# Altium footprint library Xavier_NX_Carrier_Board_v1.1.PcbLib: 52 footprints (part 2 of 4)
Each footprint in its own frame and in the unit in brackets; x right, y up, seen from the top. Pads: shape width x height; smd on the part's side, far side on the other; paste and mask are expansions set on the pad; w line width, h text height; cw(c..) or ccw(c..) is an arc to the next point about the centre after c.
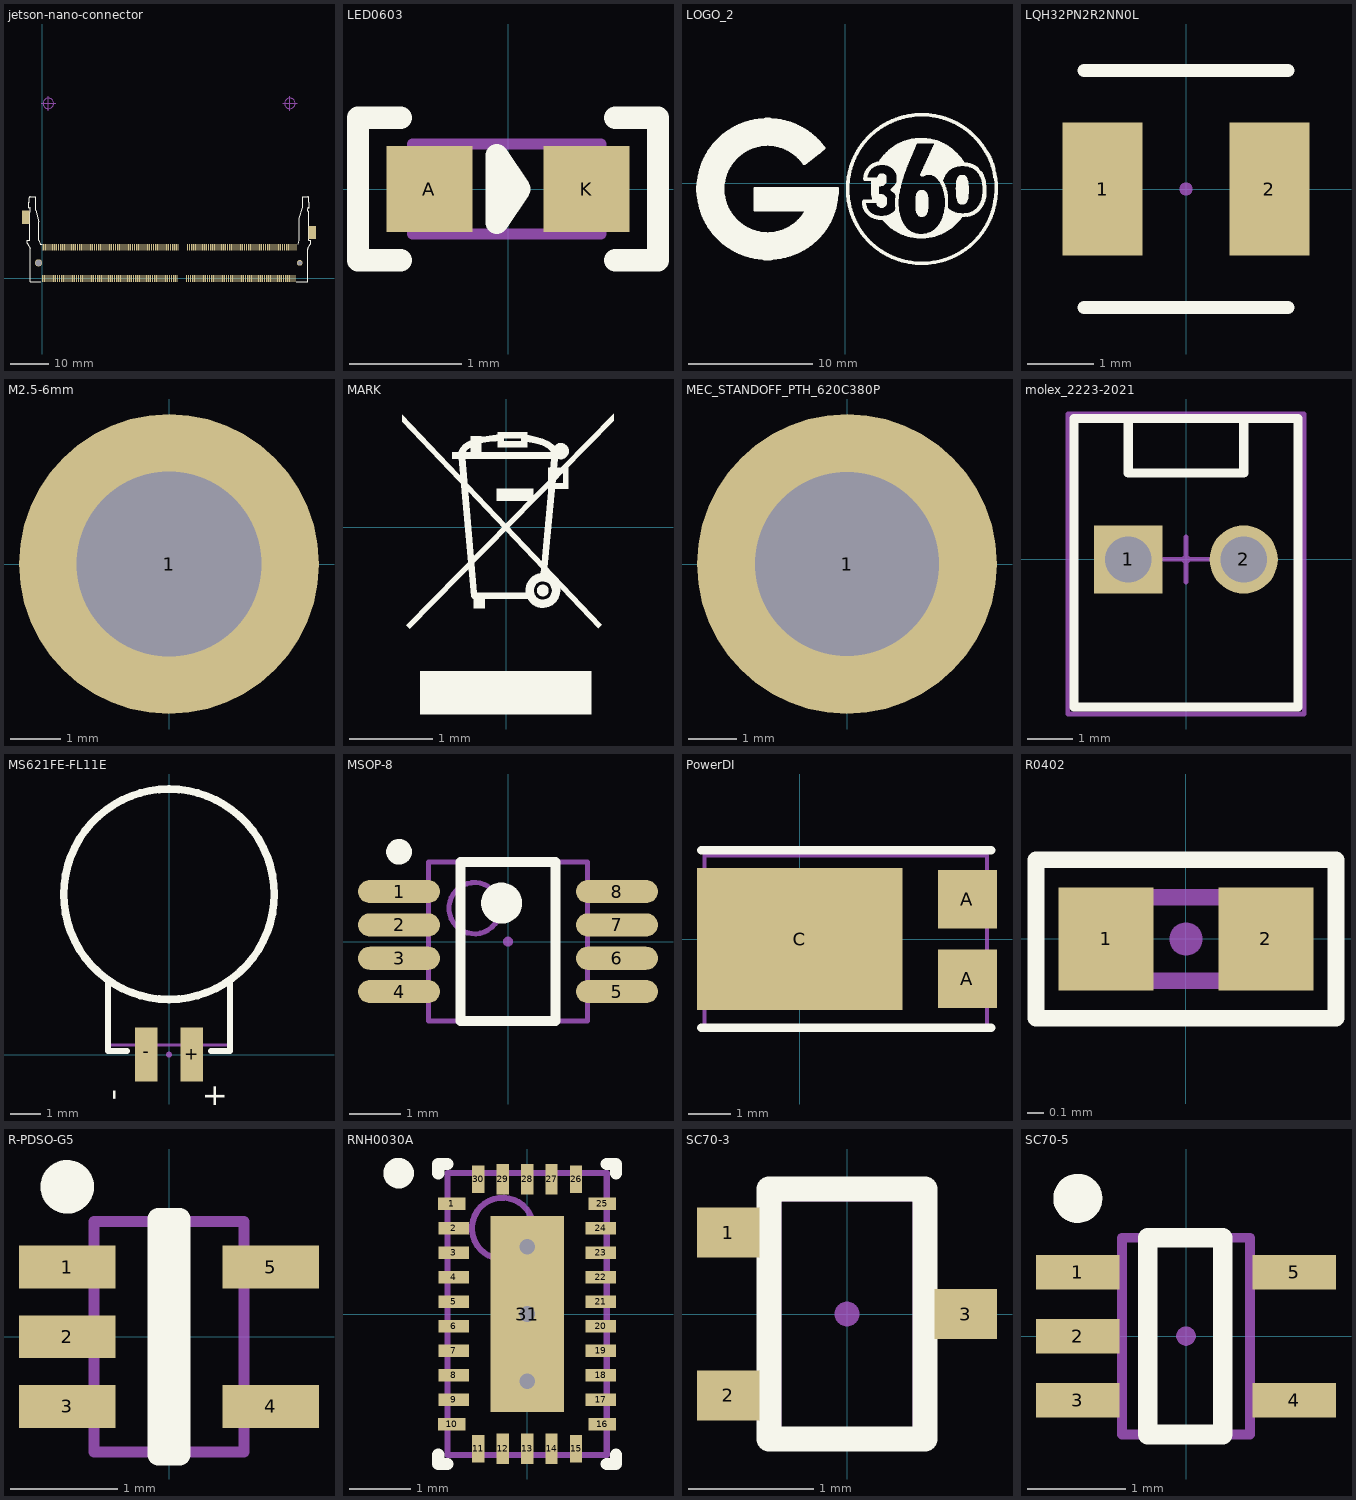
[diagram p1: the footprints below, top view; thin cyan lines are the x and y axes]

## jetson-nano-connector [mm]
pads (265):
  rect 0.3x1.75 smd mask+0.05: 1(0,0) 2(0.25,8.2) 3(0.5,0) 4(0.75,8.2) 5(1,0) 6(1.25,8.2) 7(1.5,0) 8(1.75,8.2) 9(2,0) 10(2.25,8.2) 11(2.5,0) 12(2.75,8.2) 13(3,0) 14(3.25,8.2) 15(3.5,0) 16(3.75,8.2) 17(4,0) 18(4.25,8.2) 19(4.5,0) 20(4.75,8.2) 21(5,0) 22(5.25,8.2) 23(5.5,0) 24(5.75,8.2) 25(6,0) 26(6.25,8.2) 27(6.5,0) 28(6.75,8.2) 29(7,0) 30(7.25,8.2) 31(7.5,0) 32(7.75,8.2) 33(8,0) 34(8.25,8.2) 35(8.5,0) 36(8.75,8.2) 37(9,0) 38(9.25,8.2) 39(9.5,0) 40(9.75,8.2) 41(10,0) 42(10.25,8.2) 43(10.5,0) 44(10.75,8.2) 45(11,0) 46(11.25,8.2) 47(11.5,0) 48(11.75,8.2) 49(12,0) 50(12.25,8.2) 51(12.5,0) 52(12.75,8.2) 53(13,0) 54(13.25,8.2) 55(13.5,0) 56(13.75,8.2) 57(14,0) 58(14.25,8.2) 59(14.5,0) 60(14.75,8.2) 61(15,0) 62(15.25,8.2) 63(15.5,0) 64(15.75,8.2) 65(16,0) 66(16.25,8.2) 67(16.5,0) 68(16.75,8.2) 69(17,0) 70(17.25,8.2) 71(17.5,0) 72(17.75,8.2) 73(18,0) 74(18.25,8.2) 75(18.5,0) 76(18.75,8.2) 77(19,0) 78(19.25,8.2) 79(19.5,0) 80(19.75,8.2) 81(20,0) 82(20.25,8.2) 83(20.5,0) 84(20.75,8.2) 85(21,0) 86(21.25,8.2) 87(21.5,0) 88(21.75,8.2) 89(22,0) 90(22.25,8.2) 91(22.5,0) 92(22.75,8.2) 93(23,0) 94(23.25,8.2) 95(23.5,0) 96(23.75,8.2) 97(24,0) 98(24.25,8.2) 99(24.5,0) 100(24.75,8.2) 101(25,0) 102(25.25,8.2) 103(25.5,0) 104(25.75,8.2) 105(26,0) 106(26.25,8.2) 107(26.5,0) 108(26.75,8.2) 109(27,0) 110(27.25,8.2) 111(27.5,0) 112(27.75,8.2) 113(28,0) 114(28.25,8.2) 115(28.5,0) 116(28.75,8.2) 117(29,0) 118(29.25,8.2) 119(29.5,0) 120(29.75,8.2) 121(30,0) 122(30.25,8.2) 123(30.5,0) 124(30.75,8.2) 125(31,0) 126(31.25,8.2) 127(31.5,0) 128(31.75,8.2) 129(32,0) 130(32.25,8.2) 131(32.5,0) 132(32.75,8.2) 133(33,0) 134(33.25,8.2) 135(33.5,0) 136(33.75,8.2) 137(34,0) 138(34.25,8.2) 139(34.5,0) 140(34.75,8.2) 141(35,0) 142(35.25,8.2) 143(35.5,0) 144(35.75,8.2) 145(38,0) 146(38.25,8.2) 147(38.5,0) 148(38.75,8.2) 149(39,0) 150(39.25,8.2) 151(39.5,0) 152(39.75,8.2) 153(40,0) 154(40.25,8.2) 155(40.5,0) 156(40.75,8.2) 157(41,0) 158(41.25,8.2) 159(41.5,0) 160(41.75,8.2) 161(42,0) 162(42.25,8.2) 163(42.5,0) 164(42.75,8.2) 165(43,0) 166(43.25,8.2) 167(43.5,0) 168(43.75,8.2) 169(44,0) 170(44.25,8.2) 171(44.5,0) 172(44.75,8.2) 173(45,0) 174(45.25,8.2) 175(45.5,0) 176(45.75,8.2) 177(46,0) 178(46.25,8.2) 179(46.5,0) 180(46.75,8.2) 181(47,0) 182(47.25,8.2) 183(47.5,0) 184(47.75,8.2) 185(48,0) 186(48.25,8.2) 187(48.5,0) 188(48.75,8.2) 189(49,0) 190(49.25,8.2) 191(49.5,0) 192(49.75,8.2) 193(50,0) 194(50.25,8.2) 195(50.5,0) 196(50.75,8.2) 197(51,0) 198(51.25,8.2) 199(51.5,0) 200(51.75,8.2) 201(52,0) 202(52.25,8.2) 203(52.5,0) 204(52.75,8.2) 205(53,0) 206(53.25,8.2) 207(53.5,0) 208(53.75,8.2) 209(54,0) 210(54.25,8.2) 211(54.5,0) 212(54.75,8.2) 213(55,0) 214(55.25,8.2) 215(55.5,0) 216(55.75,8.2) 217(56,0) 218(56.25,8.2) 219(56.5,0) 220(56.75,8.2) 221(57,0) 222(57.25,8.2) 223(57.5,0) 224(57.75,8.2) 225(58,0) 226(58.25,8.2) 227(58.5,0) 228(58.75,8.2) 229(59,0) 230(59.25,8.2) 231(59.5,0) 232(59.75,8.2) 233(60,0) 234(60.25,8.2) 235(60.5,0) 236(60.75,8.2) 237(61,0) 238(61.25,8.2) 239(61.5,0) 240(61.75,8.2) 241(62,0) 242(62.25,8.2) 243(62.5,0) 244(62.75,8.2) 245(63,0) 246(63.25,8.2) 247(63.5,0) 248(63.75,8.2) 249(64,0) 250(64.25,8.2) 251(64.5,0) 252(64.75,8.2) 253(65,0) 254(65.25,8.2) 255(65.5,0) 256(65.75,8.2) 257(66,0) 258(66.25,8.2) 259(66.5,0) 260(66.75,8.2)
  rect 2x3.5 smd mask+0.05: 261(71.1,12.1) 262(-4.4,16.1)
  round 1.9 hole 1.6 unplated mask+0.05: M(-1.025,4.1)
  round 1.5 hole 1.1 unplated mask+0.05: M(67.775,4.1)
  round 0.2 on Mech4: ""(0,0)
Top Overlay:
  lines w0.1: -3.403,21.287 cw(c-3.203,21.287) -3.203,21.487 ; -3.303,17.5 ccw(c-3.303,17.65) -3.153,17.65 ; -3.303,18.583 cw(c-3.303,18.433) -3.153,18.433 ; 69.165,21.505 ccw(c69.205,21.65) 69.205,21.5 ; 69.875,17.8 ccw(c70.075,17.8) 70.075,17.6 ; 69.875,18.4 cw(c70.075,18.4) 70.075,18.6 ; 69.925,21.5 cw(c69.925,21.3) 70.125,21.3 ; -3.925,9.287 ccw(c-3.425,9.287) -3.855,9.032 cw(c-3.425,9.287) -3.925,9.287 ; -3.195,7.918 cw(c-3.625,7.663) -3.125,7.663 ccw(c-3.625,7.663) -3.195,7.918 ; 69.875,7.663 cw(c70.375,7.663) 69.945,7.918 ccw(c70.375,7.663) 69.875,7.663 ; 70.605,9.032 ccw(c70.175,9.287) 70.675,9.287 cw(c70.175,9.287) 70.605,9.032
  lines w0.2: -3.403,21.287 -3.403,20.072 -3.552,20.072 -3.552,18.583 -3.303,18.583 ; -3.379,17.5 -3.379,10.1 -3.925,10.05 ; -3.203,21.487 -2.296,21.487 -2.296,21.49 -1.796,21.49 -1.796,17.972 -0.925,14.934 -0.925,10.05 -0.575,8.95 -0.075,8.95 ; -3.153,17.65 -3.153,18.433 ; 67.425,8.95 67.675,10.05 ; 69.165,21.505 68.555,21.505 68.555,18.782 67.675,15.782 ; 69.205,21.5 69.925,21.5 ; 69.875,17.8 69.875,18.4 ; 70.075,17.6 70.12,17.6 70.12,10.1 70.675,10.05 ; 70.075,18.6 70.311,18.6 70.311,20.1 70.125,20.1 70.125,21.3 ; -3.925,10.05 -3.925,9.287 -3.925,10.05 ; -3.125,-0.9 -0.375,-0.9 -3.125,-0.9 ; -3.125,-0.9 -3.125,7.663 -3.125,-0.9 ; 67.675,10.05 67.675,15.782 ; 67.675,10.05 67.675,15.782 ; 69.875,-0.9 66.875,-0.9 69.875,-0.9 ; 69.875,-0.9 69.875,7.663 69.875,-0.9 ; 70.675,10.05 70.675,9.287 70.675,10.05 ; -3.855,9.032 -3.195,7.918 -3.855,9.032 ; 69.945,7.918 70.605,9.032 69.945,7.918
Mechanical 3:
  circle w0.1: c65.175,46.1 r1.375
  circle w0.1: c1.575,46.1 r1.375
  lines w0.1: -0.325,46.1 1.575,46.1 ; 1.575,44.2 1.575,46.1 ; 1.575,48 1.575,46.1 ; 3.475,46.1 1.575,46.1 ; 63.277,46.1 65.177,46.1 ; 65.177,44.2 65.177,46.1 ; 65.177,48 65.177,46.1 ; 67.077,46.1 65.177,46.1
  text "module mounting holes placement taken from 3D models" at 13.7,45.975 h0.76
  text "its real position may differ" at 22.725,44.9 h0.76
3D body "c-2309413-1-1-3d.stp": height 9.23, standoff -0.42, extent -4.7,-0.8 71.399,25.05

## LED0603 [mil]
pads (3):
  rect 30x30 smd mask+1.97: A(-27.5,0) K(27.5,0)
  round 7.87 on Mech4: ""(0,0)
Top Overlay:
  lines w7.87: -37.5,-25 -52.5,-25 -52.5,25 -37.5,25 ; 37.5,-25 52.5,-25 52.5,25 37.5,25 ; -3.88,-11.81 -3.88,11.81 4,0 -3.88,-11.81
Mechanical 4:
  lines w3.94: -33.46,-15.75 32.48,-15.75 32.48,15.75 -33.46,15.75 -33.46,-15.75
3D body "User Library-led0603_GRE.step": height 43.31, standoff 0, extent -32.81,-15.75 30.97,15.75

## LOGO_2 [mm]
Top Overlay:
  drawing of 2733 lines, arcs and shapes, not listed

## LQH32PN2R2NN0L [mm]
pads (3):
  rect 1.2x2 smd mask+0.05: 1(-1.25,0) 2(1.25,0)
  round 0.2 on Mech4: ""(0,0)
Top Overlay:
  lines w0.2: -1.524,-1.778 1.524,-1.778 ; -1.524,1.778 1.524,1.778
3D body: height 1.4, standoff 0.1, extent -1.524,-1.524 1.524,1.651

## M2.5-6mm [mm]
pads (2):
  round 6 / inner round 0 / far side round 0 hole 3.7 mask+0.05: 1(0,0)
  round 0.2 on Mech4: ""(0,0)
Top Paste:
  drawing of 4 lines, arcs and shapes, not listed
Mechanical 4:
  circle w0.1: c0,0 r2.55
3D body "9774060151.stp": height 6, standoff -1.4, extent -2.55,-2.547 2.55,2.547

## MARK [mm]
Top Overlay:
  drawing of 23 lines, arcs and shapes, not listed

## MEC_STANDOFF_PTH_620C380P [mm]
pads (1):
  round 6.2 / inner round 0 / far side round 0 hole 3.8: 1(0,0)
Top Paste:
  drawing of 4 lines, arcs and shapes, not listed
3D body: height 1.4, standoff 0, extent -3.31,-3.31 3.31,3.31

## molex_2223-2021 [mm]
pads (3):
  rect 1.5x1.5 hole 1.02 mask+0.05: 1(-1.27,0)
  round 1.5 hole 1.02 mask+0.05: 2(1.27,0)
  round 0.2 on Mech4: ""(0,0)
Top Overlay:
  lines w0.2: -1.27,3.1 -1.27,1.905 1.27,1.905 1.27,3.1 ; -2.465,-3.25 2.465,-3.25 2.465,3.1 -2.465,3.1 -2.465,-3.25
Mechanical 13:
  lines w0.1: -1.27,3.1 -1.27,1.905 1.27,1.905 1.27,3.1 ; -2.465,-3.25 2.465,-3.25 2.465,3.1 -2.465,3.1 -2.465,-3.25
Mechanical 15:
  lines w0.1: -0.5,0 0.5,0 ; 0,-0.5 0,0.5 ; -2.6,-3.4 -2.6,3.2 2.6,3.2 2.6,-3.4 -2.6,-3.4
3D body "MX-02223-2021.stp": height 10.68, standoff -3.54, extent -2.489,-3.2 2.438,3.15

## MS621FE-FL11E [mm]
pads (3):
  rect 0.75x1.8 smd mask+0.05: +(0.75,0) -(-0.75,0)
  round 0.2 on Mech4: ""(0,0)
Top Overlay:
  circle w0.254: c0,5.334 r3.5
  lines w0.2: -2.032,2.413 -2.032,0.127 -1.397,0.127 ; 1.397,0.127 2.032,0.127 2.032,2.413
  text "+" at 1.213,-0.96 h0.76
  text "-" at -1.524,-1.143 h0.76
Mechanical 4:
  circle w0.1: c0,5.334 r3.5
  lines w0.1: -2.032,2.413 -2.032,0.325 2.032,0.325 2.032,2.413
3D body "battery.step": height 2.69, standoff -0.01, extent -3.429,-0.586 3.371,8.714

## MSOP-8 [mm]
pads (9):
  oval 1.6x0.45 smd mask+0.05: 1(-2.125,0.975) 2(-2.125,0.325) 3(-2.125,-0.325) 4(-2.125,-0.975) 5(2.125,-0.975) 6(2.125,-0.325) 7(2.125,0.325) 8(2.125,0.975)
  round 0.2 on Mech4: ""(0,0)
Top Overlay:
  circle w0.4: c-0.125,0.75 r0.2
  circle w0.25: c-2.125,1.75 r0.125
  lines w0.2: -0.925,-1.55 0.925,-1.55 0.925,1.55 -0.925,1.55 -0.925,-1.55
Mechanical 4:
  circle w0.1: c-0.65,0.65 r0.5
  lines w0.1: -1.55,-1.55 -1.55,1.55 1.55,1.55 1.55,-1.55 -1.55,-1.55
3D body "User Library-msop-8.step": height 1.15, standoff 0, extent -2.45,-1.524 2.45,1.476

## PowerDI [mm]
pads (4):
  rect 1.4x1.39 smd mask+0.05: A(3.962,-0.94) A(3.962,0.94)
  rect 4.86x3.36 smd mask+0.05: C(0,0)
  round 0.2 on Mech4: ""(0,0)
Top Overlay:
  lines w0.2: -2.325,-2.1 4.525,-2.1 ; -2.325,2.1 4.525,2.1
Mechanical 4:
  lines w0.1: -2.25,-2.075 4.425,-2.075 4.425,1.975 -2.25,1.975 -2.25,-2.075
3D body "User Library-PowerDI-5.STEP": height 1.17, standoff 0.02, extent -2.208,-2.083 4.392,1.967

## R0402 [mm]
pads (3):
  rect 0.57x0.62 smd mask+0.05: 1(-0.48,0) 2(0.48,0)
  round 0.2 on Mech4: ""(0,0)
Top Overlay:
  lines w0.1: -0.9,-0.475 0.9,-0.475 0.9,0.475 -0.9,0.475 -0.9,-0.475
Mechanical 4:
  lines w0.1: -0.5,-0.25 -0.5,0.25 0.5,0.25 0.5,-0.25 -0.5,-0.25
3D body "User Library-R SMD 0402.STEP": height 0.35, standoff 0, extent -0.472,-0.25 0.528,0.25

## R-PDSO-G5 [mm]
pads (6):
  rect 0.9x0.4 smd mask+0.05: 1(-0.95,0.65) 2(-0.95,0) 3(-0.95,-0.65) 4(0.95,-0.65) 5(0.95,0.65)
  round 0.2 on Mech4: ""(0,0)
Top Overlay:
  circle w0.25: c-0.95,1.4 r0.125
  lines w0.2: -0.1,-1.1 0.1,-1.1 0.1,1.1 -0.1,1.1 -0.1,-1.1
Mechanical 4:
  lines w0.1: -0.7,-1.075 -0.7,1.075 0.7,1.075 0.7,-1.075 -0.7,-1.075
3D body: height 1.1, standoff 0, extent -0.7,-1.075 0.7,1.075

## RNH0030A [mm]
pads (32):
  rect 0.45x0.2 smd mask+0.05: 1(-1.23,1.8) 10(-1.23,-1.8) 16(1.225,-1.8) 25(1.225,1.8)
  rect 0.5x0.2 smd mask+0.05: 2(-1.2,1.4) 3(-1.2,1) 4(-1.2,0.6) 5(-1.2,0.2) 6(-1.2,-0.2) 7(-1.2,-0.6) 8(-1.2,-1) 9(-1.2,-1.4) 17(1.2,-1.4) 18(1.2,-1) 19(1.2,-0.6) 20(1.2,-0.2) 21(1.2,0.2) 22(1.2,0.6) 23(1.2,1) 24(1.2,1.4)
  rect 0.2x0.45 smd mask+0.05: 11(-0.8,-2.2) 15(0.8,-2.2) 26(0.8,2.2) 30(-0.8,2.2)
  rect 0.2x0.5 smd mask+0.05: 12(-0.4,-2.2) 13(0,-2.2) 14(0.4,-2.2) 27(0.4,2.2) 28(0,2.2) 29(-0.4,2.2)
  rect 1.2x3.2 smd mask+0.05: 31(0,0)
  round 0.2 on Mech4: ""(0,0)
via 0,-1.1 diameter 0.508 hole 0.254
via 0,0 diameter 0.508 hole 0.254
via 0,1.1 diameter 0.508 hole 0.254
Top Overlay:
  circle w0.25: c-2.1,2.3 r0.125
  lines w0.2: -1.45,-2.3 -1.45,-2.45 -1.3,-2.45 ; -1.45,2.3 -1.45,2.45 -1.3,2.45 ; 1.3,-2.45 1.45,-2.45 1.45,-2.3 ; 1.3,2.45 1.45,2.45 1.45,2.3
Mechanical 4:
  circle w0.1: c-0.4,1.4 r0.5
  lines w0.1: -1.3,-2.3 -1.3,2.3 1.3,2.3 1.3,-2.3 -1.3,-2.3
3D body: height 0.8, standoff 0.05, extent -1.3,-2.3 1.3,2.3

## SC70-3 [mm]
pads (4):
  rect 0.5x0.4 smd mask+0.05: 1(-0.95,0.65) 2(-0.95,-0.65) 3(0.95,0)
  round 0.2 on Mech4: ""(0,0)
Top Overlay:
  lines w0.2: -0.625,-1 0.625,-1 0.625,1 -0.625,1 -0.625,-1
Mechanical 4:
  lines w0.1: -0.575,-0.975 -0.575,0.95 0.575,0.95 0.575,-0.975 -0.575,-0.975
3D body "sc70-3.step": height 1, standoff 0, extent -1.15,-1.075 1.15,1.025

## SC70-5 [mm]
pads (6):
  rect 0.85x0.35 smd mask+0.05: 1(-1.1,0.65) 2(-1.1,0) 3(-1.1,-0.65) 4(1.1,-0.65) 5(1.1,0.65)
  round 0.2 on Mech4: ""(0,0)
Top Overlay:
  circle w0.25: c-1.1,1.4 r0.125
  lines w0.2: -0.389,-1 -0.389,1 0.373,1 0.373,-1 -0.389,-1
Mechanical 4:
  lines w0.1: -0.65,-1 0.65,-1 0.65,1 -0.65,1 -0.65,-1
3D body "User Library-SC70-5-1.step": height 0.96, standoff 0.01, extent -1.032,-0.985 1.068,1.015